# Altium footprint library Universal components.PcbLib: 101 footprints (part 1 of 7)
Each footprint in its own frame and in the unit in brackets; x right, y up, seen from the top. Pads: shape width x height; smd on the part's side, far side on the other; paste and mask are expansions set on the pad; w line width, h text height; cw(c..) or ccw(c..) is an arc to the next point about the centre after c.
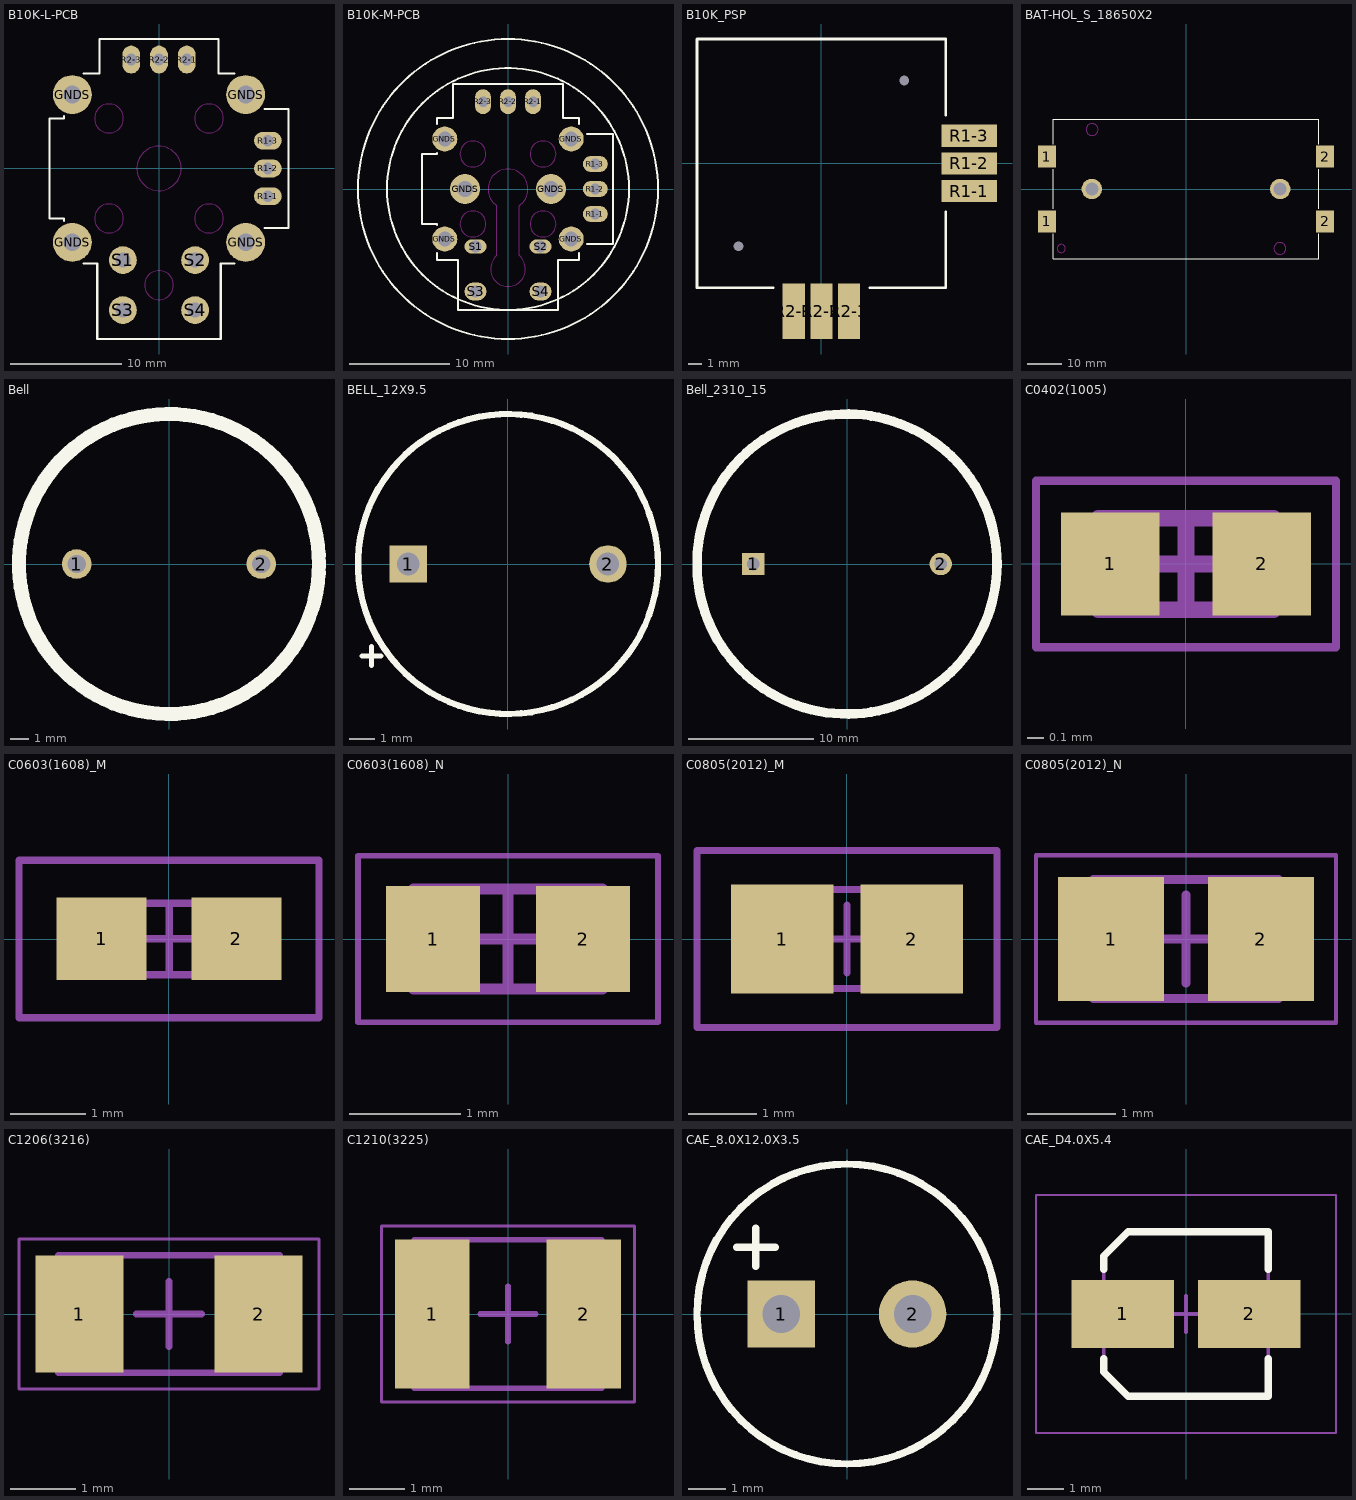
[diagram p0: the footprints below, top view; thin cyan lines are the x and y axes]

## B10K-L-PCB [mm]
pads (14):
  round 3.5 hole 1.6 paste+0 mask+0.1: GNDS(-7.8,-6.65) GNDS(-7.8,6.65) GNDS(7.8,-6.65) GNDS(7.8,6.65)
  oval 2.5x1.6 hole 1.05 paste+0 mask+0.1: R1-1(9.8,-2.5) R1-2(9.8,0) R1-3(9.8,2.5)
  oval 1.6x2.5 hole 1.05 paste+0 mask+0.1: R2-1(2.5,9.8) R2-2(0,9.8) R2-3(-2.5,9.8)
  round 2.5 hole 1.35 paste+0 mask+0.1: S1(-3.25,-8.25) S2(3.25,-8.25) S3(-3.25,-12.75) S4(3.25,-12.75)
Top Overlay:
  lines w0.2: -9.85,4.5 -9.85,-4.5 -8.55,-4.5 -8.55,-4.7 ; -9.82,4.5 -8.55,4.5 -8.55,4.7 ; -6.8,-8.55 -5.55,-8.55 -5.55,-15.35 5.55,-15.35 5.55,-8.55 6.8,-8.55 ; -6.8,8.55 -5.35,8.55 -5.35,11.64 ; -5.35,11.65 5.35,11.65 5.35,8.55 ; 5.36,8.55 6.8,8.55 ; 9.5,-5.35 11.65,-5.35 11.65,5.35 ; 9.5,5.35 11.64,5.35
Keep-Out Layer:
  circle w0.01: c0,-10.5 r1.3
  circle w0.01: c4.5,-4.5 r1.3
  circle w0.01: c-4.5,-4.5 r1.3
  circle w0.01: c4.5,4.5 r1.3
  circle w0.01: c-4.5,4.5 r1.3
  circle w0.01: c0,0 r2
3D body "RKJXK122400Y.STEP": height 19, standoff -4, extent -9.525,-14.34 11.225,11.225

## B10K-M-PCB [mm]
pads (16):
  round 2.5 hole 1.5 paste+0 mask+0.1: GNDS(-6.325,-5) GNDS(-6.325,5) GNDS(6.325,-5) GNDS(6.325,5)
  round 3 hole 1.6 paste+0 mask+0.1: GNDS(-4.3,0) GNDS(4.3,0)
  oval 2.5x1.6 hole 1.05 paste+0 mask+0.1: R1-1(8.73,-2.5) R1-2(8.73,0) R1-3(8.73,2.5)
  oval 1.6x2.5 hole 1.05 paste+0 mask+0.1: R2-1(2.5,8.73) R2-2(0,8.73) R2-3(-2.5,8.73)
  oval 2.2x1.4 hole 1.2 paste+0 mask+0.1: S1(-3.25,-5.75) S2(3.25,-5.75)
  oval 2.2x1.8 hole 1.2 paste+0 mask+0.1: S3(-3.25,-10.25) S4(3.25,-10.25)
Top Overlay:
  circle w0.2: c0,0 r12.1
  circle w0.2: c0,0 r15
  lines w0.2: -7.4,4.7 -7.08,4.38 ; -7.34,-4.7 -7.08,-4.44 ; -7.08,-6.4 -7.08,-7.08 -5,-7.08 -5,-12.1 5,-12.1 5,-7.08 7.08,-7.08 7.08,-6.4 ; -7.08,-3.6 -7.08,-3.5 -8.6,-3.5 -8.6,3.5 -7.08,3.5 -7.08,3.6 ; -7.08,6.5 -7.08,7.08 -5.5,7.08 -5.5,10.5 5.5,10.5 5.5,7.08 7.08,7.08 7.08,6.5 ; 7.9,-5.5 10.5,-5.5 10.5,5.5 7.9,5.5
Keep-Out Layer:
  circle w0.01: c3.5,-3.5 r1.3
  circle w0.01: c-3.5,-3.5 r1.3
  circle w0.01: c3.5,3.5 r1.3
  circle w0.01: c-3.5,3.5 r1.3
  lines w0.01: -1.1,-6.64 ccw(c0,-8) 1.1,-6.64 1.1,-1.67 ccw(c0,0) -1.1,-1.67 -1.1,-6.64
3D body "RKJXV1224005.STEP": height 18.85, standoff -3, extent -8.112,-11.6 9.675,9.675

## B10K_PSP [mm]
pads (8):
  round 0 hole 0.7 unplated paste+0 mask+0.1: 0(-6,-6) 0(6,6)
  rect 4x1.6 smd paste+0 mask+0.1: R1-1(10.7,-2) R1-2(10.7,0) R1-3(10.7,2)
  rect 1.6x4 smd paste+0 mask+0.1: R2-1(-2,-10.7) R2-2(0,-10.7) R2-3(2,-10.7)
Top Overlay:
  lines w0.2: -3.5,-9 -9,-9 -9,9 9,9 9,3.5 ; 3.5,-9 9,-9 9,-3.5
3D body "电位器.stp": height 9.58, standoff 0.03, extent -8.85,-8.975 8.85,8.975

## BAT-HOL_S_18650X2 [mm] "Battery Holder, Surface mount, 18650 battery  2 cells"
pads (6):
  rect 5.4x6.45 smd paste+0 mask+0.1: 1(-40.9,-9.55) 1(-40.9,9.55) 2(40.9,-9.55) 2(40.9,9.55)
  round 6 hole 3.8 paste+0 mask+0.1: ""(-27.7,0) ""(27.7,0)
Top Overlay:
  lines w0.2: -39.05,-13.2 -39.05,-20.45 39.05,-20.45 39.05,-13.2 ; -39.05,-5.8 -39.05,5.8 ; -39.05,13.2 -39.05,20.45 39.05,20.45 39.05,13.2 ; 39.05,-5.8 39.05,5.8
Keep-Out Layer:
  circle w0.01: c-27.6,17.5 r1.75
  circle w0.01: c27.6,-17.5 r1.75
  circle w0.01: c-36.69,-17.5 r1.2
3D body "User Library-18650 holder x2.step": height 21, standoff 0, extent -38,-20.5 38,20.5

## Bell [mm]
pads (2):
  round 1.6 hole 1: 1(-5,0) 2(5,0)
Top Overlay:
  circle w0.762: c0,0 r8.128
3D body "蜂鸣器.STEP": height 7, standoff -4.8, extent -8.5,-8.5 8.5,8.5

## BELL_12X9.5 [mm]
pads (2):
  rect 1.5x1.5 hole 0.9: 1(-4,0)
  round 1.5 hole 0.9: 2(4,0)
Top Overlay:
  circle w0.254: c0,0 r6
  lines w0.2: -5.842,-3.683 -5.08,-3.683 ; -5.461,-4.064 -5.461,-3.302
3D body "User Library-Buzzer CEM-1205C.SLDPRT": height 9, standoff -4, extent -6,-6 6,6

## Bell_2310_15 [mm]
pads (2):
  rect 1.8x1.8 hole 1: 1(-7.5,0)
  round 1.8 hole 1: 2(7.5,0)
Top Overlay:
  circle w0.762: c0,0 r12
3D body "CEP-2224.stp": height 8.6, standoff -6, extent -12,-12 12,12

## C0402(1005) [mm] "Chip Inductor, 2-Leads, Body 1.00x0.50mm, IPC Medium Density"
height 0.55
pads (2):
  rect 0.59x0.62 smd: 1(-0.455,0) 2(0.455,0)
Mechanical 13:
  lines w0.1: -0.525,-0.275 -0.525,0.275 0.525,0.275 0.525,-0.275 -0.525,-0.275
Mechanical 15:
  lines w0.05: -0.9,-0.5 -0.9,0.5 0.9,0.5 0.9,-0.5 -0.9,-0.5
  lines w0.1: -0.275,0 0.275,0 ; 0,-0.275 0,0.275
3D body "User Library-Capacitor 0402.step": height 0.47, standoff -0.03, extent -0.5,-0.25 0.5,0.25

## C0603(1608)_M [mm] "Chip Capacitor, Body 1.6x0.8mm, IPC Low Density"
height 0.85
pads (2):
  rect 1.2x1.1 smd: 1(-0.9,0) 2(0.9,0)
Mechanical 13:
  lines w0.1: -0.875,-0.475 -0.875,0.475 0.875,0.475 0.875,-0.475 -0.875,-0.475
Mechanical 15:
  lines w0.1: -0.475,0 0.475,0 ; 0,-0.475 0,0.475 ; -2,-1.05 -2,1.05 2,1.05 2,-1.05 -2,-1.05
3D body "User Library-Chip Capacitor2_0603.step": height 0.86, standoff 0, extent -0.8,-0.4 0.8,0.4

## C0603(1608)_N [mm] "Chip Capacitor, 2-Leads, Body 1.60x0.80mm, IPC Medium Density"
height 0.9
pads (2):
  rect 0.85x0.95 smd: 1(-0.675,0) 2(0.675,0)
Mechanical 13:
  lines w0.1: -0.85,-0.45 0.85,-0.45 0.85,0.45 -0.85,0.45 -0.85,-0.45
Mechanical 15:
  lines w0.05: -1.35,-0.75 1.35,-0.75 1.35,0.75 -1.35,0.75 -1.35,-0.75
  lines w0.1: -0.45,0 0.45,0 ; 0,-0.45 0,0.45
3D body "User Library-Chip Capacitor2_0603.step": height 0.86, standoff 0, extent -0.8,-0.4 0.8,0.4

## C0805(2012)_M [mm] "Chip Capacitor, Body 2.0x1.3mm, IPC Low Density"
height 1.1
pads (2):
  rect 1.5x1.6 smd: 1(-0.95,0) 2(0.95,0)
Mechanical 13:
  lines w0.1: -1.1,-0.725 1.1,-0.725 1.1,0.725 -1.1,0.725 -1.1,-0.725
Mechanical 15:
  lines w0.1: -0.5,0 0.5,0 ; 0,-0.5 0,0.5 ; -2.2,-1.3 2.2,-1.3 2.2,1.3 -2.2,1.3 -2.2,-1.3
3D body "User Library-0805 SMD Capacitor.step": height 0.78, standoff 0, extent -1,-0.625 1,0.625

## C0805(2012)_N [mm] "Chip Capacitor, 2-Leads, Body 2.00x1.25mm, IPC Medium Density"
height 1.35
pads (2):
  rect 1.2x1.4 smd: 1(-0.85,0) 2(0.85,0)
Mechanical 13:
  lines w0.1: -1.05,-0.675 1.05,-0.675 1.05,0.675 -1.05,0.675 -1.05,-0.675
Mechanical 15:
  lines w0.05: -1.7,-0.95 1.7,-0.95 1.7,0.95 -1.7,0.95 -1.7,-0.95
  lines w0.1: -0.5,0 0.5,0 ; 0,-0.5 0,0.5
3D body "User Library-0805 SMD Capacitor.step": height 0.78, standoff 0, extent -1,-0.625 1,0.625

## C1206(3216) [mm] "Chip Capacitor, 2-Leads, Body 3.20x1.60mm, IPC Medium Density"
height 1.8
pads (2):
  rect 1.35x1.8 smd: 1(-1.375,0) 2(1.375,0)
Mechanical 13:
  lines w0.1: -1.7,-0.9 -1.7,0.9 1.7,0.9 1.7,-0.9 -1.7,-0.9
Mechanical 15:
  lines w0.05: -2.3,-1.15 -2.3,1.15 2.3,1.15 2.3,-1.15 -2.3,-1.15
  lines w0.1: -0.5,0 0.5,0 ; 0,-0.5 0,0.5
3D body "User Library-1206 SMD Capacitor.step": height 1, standoff 0, extent -1.6,-0.8 1.6,0.8

## C1210(3225) [mm] "Chip Capacitor, 2-Leads, Body 3.20x2.50mm, IPC Medium Density"
height 2
pads (2):
  rect 1.35x2.7 smd: 1(-1.375,0) 2(1.375,0)
Mechanical 13:
  lines w0.1: -1.7,-1.35 1.7,-1.35 1.7,1.35 -1.7,1.35 -1.7,-1.35
Mechanical 15:
  lines w0.05: -2.3,-1.6 2.3,-1.6 2.3,1.6 -2.3,1.6 -2.3,-1.6
  lines w0.1: -0.5,0 0.5,0 ; 0,-0.5 0,0.5
3D body "1210 (3.2х2.6х2.5) Capacitor.STEP": height 2.5, standoff 0, extent -1.6,-1.3 1.6,1.3

## CAE_8.0X12.0X3.5 [mm] "脚距3.5mm"
pads (2):
  rect 1.8x1.8 hole 1: 1(-1.75,0)
  round 1.8 hole 1: 2(1.75,0)
Top Overlay:
  circle w0.2: c0,0 r4
  lines w0.2: -2.935,1.778 -1.919,1.778 ; -2.427,1.27 -2.427,2.286
3D body "User Library-Cap electro 8x11_5x3_5mm.SLDPRT": height 12.03, standoff -3.48, extent -4.025,-4.025 4.025,4.025

## CAE_D4.0X5.4 [mm] "Aluminum Electrolytic Capacitor, Body 4.30x4.30x5.60mm, IPC Low Density"
height 5.6
pads (2):
  rect 2.8x1.85 smd: 1(-1.725,0) 2(1.725,0)
Top Overlay:
  lines w0.2: -2.25,-1.225 -2.25,-1.587 -1.587,-2.25 2.25,-2.25 2.25,-1.225 ; -2.25,1.225 -2.25,1.587 -1.587,2.25 2.25,2.25 2.25,1.225
Mechanical 13:
  lines w0.1: -2.25,-1.587 -1.587,-2.25 2.25,-2.25 2.25,2.25 -1.587,2.25 -2.25,1.587 -2.25,-1.587
Mechanical 15:
  lines w0.05: -4.1,-3.25 -4.1,3.25 4.1,3.25 4.1,-3.25 -4.1,-3.25
  lines w0.1: -0.5,0 0.5,0 ; 0,-0.5 0,0.5
3D body "CAPAE-D4.0x5.4.stp": height 5.5, standoff 0, extent -2.75,-2.25 2.75,2.25